# Altium integrated library Altium_PCB_Connector.IntLib: 293 symbols (part 2 of 3) (continued)
## S3B-XH-SM4-TB(LF)(SN)
designator P?
1x3P 3P XH 1 2.5mm 3 Brass Right-Angle Push-Pull,P=2.5mm Wire To Board / Wire To Wire Connector ROHS; Manufacturer: JST; Pin Number: 3; Contact Resistance: 20mOhm; Gender: Male; Rated Current: 3A; Withstanding Voltage: 1000VAC; Working Voltage: 250VAC; ComponentLink1Description: Datasheet; ComponentLink1URL: https://www.lcsc.com/datasheet/lcsc_datasheet_2304140030_JST-B2B-XH-A-LF-SN_C158012.pdf; Pitch: 2.5mm; Packaging: Bag; Type: Right Angled Bottom Locking; Supplier 1 URL: N/A; Supplier 2 URL: N/A; Supplier 3 URL: https://www.thegioiic.com/dau-xh2-54mm-3-chan-dan-smd-nam-ngang; Value: S3B-XH-SM4-TB(LF)(SN); LCSC Part #: C161860; Manufacturer Part Number: S3B-XH-SM4-TB(LF)(SN); Mount: SMD; Operating Temperature Max: + 85 C; Operating Temperature Min: - 20 C; Package / Case: 3; Supplier 1: Mouser; Supplier 1 Part Number: N/A; Supplier 2: Digi-Key; Supplier 2 Part Number: N/A; Supplier 3: thegioiic; Supplier 3 Part Number: N/A
footprint 619000311221 (2.54mm Male Left Angled Header Bottom Locking, 3p, SMD)
pins: 1, 2, 3

## S4B-XH-A(LF)(SN)
designator P?
1x4P 4P XH 1 2.5mm 4 Brass Right-Angle Push-Pull,P=2.5mm Wire To Board / Wire To Wire Connector ROHS; Manufacturer: JST; Pin Number: 4; Contact Resistance: 20mOhm; Gender: Male; Rated Current: 3A; Withstanding Voltage: 1000VAC; Working Voltage: 250VAC; ComponentLink1Description: Datasheet; ComponentLink1URL: https://www.lcsc.com/datasheet/lcsc_datasheet_2304140030_JST-B2B-XH-A-LF-SN_C158012.pdf; Pitch: 2.5mm; Packaging: Bag; Type: Right Angled Bottom Locking; Supplier 1 URL: N/A; Supplier 2 URL: N/A; Supplier 3 URL: https://www.thegioiic.com/dau-xh-2-54mm-4-chan-cong-xuyen-lo; Value: S4B-XH-A(LF)(SN); LCSC Part #: C157925; Manufacturer Part Number: S4B-XH-A(LF)(SN); Mount: THT; Operating Temperature Max: + 85 C; Operating Temperature Min: - 20 C; Package / Case: 4; Supplier 1: Mouser; Supplier 1 Part Number: N/A; Supplier 2: Digi-Key; Supplier 2 Part Number: N/A; Supplier 3: thegioiic; Supplier 3 Part Number: N/A
footprint 619000411021 (2.54mm Male Left Angled Header Bottom Locking, 4p)
pins: 1, 2, 3, 4

## S4B-XH-SM4-TB(LF)(SN)
designator P?
1x4P 4P XH 1 2.5mm 4 Brass Right-Angle Push-Pull,P=2.5mm Wire To Board / Wire To Wire Connector ROHS; Manufacturer: JST; Pin Number: 4; Contact Resistance: 20mOhm; Gender: Male; Rated Current: 3A; Withstanding Voltage: 1000VAC; Working Voltage: 250VAC; ComponentLink1Description: Datasheet; ComponentLink1URL: https://www.lcsc.com/datasheet/lcsc_datasheet_2304140030_JST-B2B-XH-A-LF-SN_C158012.pdf; Pitch: 2.5mm; Packaging: Bag; Type: Right Angled Bottom Locking; Supplier 1 URL: N/A; Supplier 2 URL: N/A; Supplier 3 URL: https://www.thegioiic.com/dau-xh2-54mm-4-chan-dan-smd-nam-ngang; Value: S4B-XH-SM4-TB(LF)(SN); LCSC Part #: C161861; Manufacturer Part Number: S4B-XH-SM4-TB(LF)(SN); Mount: SMD; Operating Temperature Max: + 85 C; Operating Temperature Min: - 20 C; Package / Case: 4; Supplier 1: Mouser; Supplier 1 Part Number: N/A; Supplier 2: Digi-Key; Supplier 2 Part Number: N/A; Supplier 3: thegioiic; Supplier 3 Part Number: N/A
footprint 619000411221 (2.54mm Male Left Angled Header Bottom Locking, 4p, SMD)
pins: 1, 2, 3, 4

## S5B-XH-A-1(LF)(SN)
designator P?
1x5P 5P XH 1 2.5mm 5 Brass Right-Angle Push-Pull,P=2.5mm Wire To Board / Wire To Wire Connector ROHS; Manufacturer: JST; Pin Number: 5; Contact Resistance: 20mOhm; Gender: Male; Rated Current: 3A; Withstanding Voltage: 1000VAC; Working Voltage: 250VAC; ComponentLink1Description: Datasheet; ComponentLink1URL: https://www.lcsc.com/datasheet/lcsc_datasheet_2304140030_JST-B2B-XH-A-LF-SN_C158012.pdf; Pitch: 2.5mm; Packaging: Bag; Type: Right Angled Bottom Locking; Supplier 1 URL: N/A; Supplier 2 URL: N/A; Supplier 3 URL: https://www.thegioiic.com/dau-xh-2-54mm-5-chan-cong-xuyen-lo; Value: S5B-XH-A-1(LF)(SN); LCSC Part #: C163038; Manufacturer Part Number: S5B-XH-A-1(LF)(SN); Mount: THT; Operating Temperature Max: + 85 C; Operating Temperature Min: - 20 C; Package / Case: 5; Supplier 1: Mouser; Supplier 1 Part Number: N/A; Supplier 2: Digi-Key; Supplier 2 Part Number: N/A; Supplier 3: thegioiic; Supplier 3 Part Number: N/A
footprint 619000511021 (2.54mm Male Locking Header, 5p)
pins: 1, 2, 3, 4, 5

## S5B-XH-SM4-TB(LF)(SN)
designator P?
1x5P 5P XH 1 2.5mm 5 Brass Right-Angle Push-Pull,P=2.5mm Wire To Board / Wire To Wire Connector ROHS; Manufacturer: JST; Pin Number: 5; Contact Resistance: 20mOhm; Gender: Male; Rated Current: 3A; Withstanding Voltage: 1000VAC; Working Voltage: 250VAC; ComponentLink1Description: Datasheet; ComponentLink1URL: https://www.lcsc.com/datasheet/lcsc_datasheet_2304140030_JST-B2B-XH-A-LF-SN_C158012.pdf; Pitch: 2.5mm; Packaging: Bag; Type: Right Angled Bottom Locking; Supplier 1 URL: N/A; Supplier 2 URL: N/A; Supplier 3 URL: https://www.thegioiic.com/dau-xh2-54mm-5-chan-dan-smd-nam-ngang; Value: S5B-XH-SM4-TB(LF)(SN); LCSC Part #: N/A; Manufacturer Part Number: S5B-XH-SM4-TB(LF)(SN); Mount: SMD; Operating Temperature Max: + 85 C; Operating Temperature Min: - 20 C; Package / Case: 5; Supplier 1: Mouser; Supplier 1 Part Number: N/A; Supplier 2: Digi-Key; Supplier 2 Part Number: N/A; Supplier 3: thegioiic; Supplier 3 Part Number: N/A
footprint 619000511221 (2.54mm Male Left Angled Header Bottom Locking, 5p, SMD)
pins: 1, 2, 3, 4, 5

## S6B-XH-A(LF)(SN)
designator P?
1x6P 6P XH 1 2.5mm 6 Brass Right-Angle Push-Pull,P=2.5mm Wire To Board / Wire To Wire Connector ROHS; Manufacturer: JST; Pin Number: 6; Contact Resistance: 20mOhm; Gender: Male; Rated Current: 3A; Withstanding Voltage: 1000VAC; Working Voltage: 250VAC; ComponentLink1Description: Datasheet; ComponentLink1URL: https://www.lcsc.com/datasheet/lcsc_datasheet_2304140030_JST-B2B-XH-A-LF-SN_C158012.pdf; Pitch: 2.5mm; Packaging: Bag; Type: Right Angled Bottom Locking; Supplier 1 URL: N/A; Supplier 2 URL: N/A; Supplier 3 URL: https://www.thegioiic.com/dau-xh-2-54mm-6-chan-cong-xuyen-lo; Value: S6B-XH-A(LF)(SN); LCSC Part #: C157919; Manufacturer Part Number: S6B-XH-A(LF)(SN); Mount: THT; Operating Temperature Max: + 85 C; Operating Temperature Min: - 20 C; Package / Case: 6; Supplier 1: Mouser; Supplier 1 Part Number: N/A; Supplier 2: Digi-Key; Supplier 2 Part Number: N/A; Supplier 3: thegioiic; Supplier 3 Part Number: N/A
footprint 619000611021 (2.54mm Male Locking Header, 6p)
pins: 1, 2, 3, 4, 5, 6

## S6B-XH-SM4-TB(LF)(SN)
designator P?
1x6P 6P XH 1 2.5mm 6 Brass Right-Angle Push-Pull,P=2.5mm Wire To Board / Wire To Wire Connector ROHS; Manufacturer: JST; Pin Number: 6; Contact Resistance: 20mOhm; Gender: Male; Rated Current: 3A; Withstanding Voltage: 1000VAC; Working Voltage: 250VAC; ComponentLink1Description: Datasheet; ComponentLink1URL: https://www.lcsc.com/datasheet/lcsc_datasheet_2304140030_JST-B2B-XH-A-LF-SN_C158012.pdf; Pitch: 2.5mm; Packaging: Bag; Type: Right Angled Bottom Locking; Supplier 1 URL: N/A; Supplier 2 URL: N/A; Supplier 3 URL: https://www.thegioiic.com/dau-xh2-54mm-6-chan-dan-smd-nam-ngang; Value: S6B-XH-SM4-TB(LF)(SN); LCSC Part #: C191914; Manufacturer Part Number: S6B-XH-SM4-TB(LF)(SN); Mount: SMD; Operating Temperature Max: + 85 C; Operating Temperature Min: - 20 C; Package / Case: 6; Supplier 1: Mouser; Supplier 1 Part Number: N/A; Supplier 2: Digi-Key; Supplier 2 Part Number: N/A; Supplier 3: thegioiic; Supplier 3 Part Number: N/A
footprint 619000611221 (2.54mm Male Left Angled Header Bottom Locking, 6p, SMD)
pins: 1, 2, 3, 4, 5, 6

## S7B-XH-A(LF)(SN)
designator P?
1x7P 7P XH 1 2.5mm 7 Brass Right-Angle Push-Pull,P=2.5mm Wire To Board / Wire To Wire Connector ROHS; Manufacturer: JST; Pin Number: 7; Contact Resistance: 20mOhm; Gender: Male; Rated Current: 3A; Withstanding Voltage: 1000VAC; Working Voltage: 250VAC; ComponentLink1Description: Datasheet; ComponentLink1URL: https://www.lcsc.com/datasheet/lcsc_datasheet_2304140030_JST-B2B-XH-A-LF-SN_C158012.pdf; Pitch: 2.5mm; Packaging: Bag; Type: Right Angled Bottom Locking; Supplier 1 URL: N/A; Supplier 2 URL: N/A; Supplier 3 URL: https://www.thegioiic.com/dau-xh-2-54mm-7-chan-cong-xuyen-lo; Value: S7B-XH-A(LF)(SN); LCSC Part #: C157916; Manufacturer Part Number: S7B-XH-A(LF)(SN); Mount: THT; Operating Temperature Max: + 85 C; Operating Temperature Min: - 20 C; Package / Case: 7; Supplier 1: Mouser; Supplier 1 Part Number: N/A; Supplier 2: Digi-Key; Supplier 2 Part Number: N/A; Supplier 3: thegioiic; Supplier 3 Part Number: N/A
footprint 619000711021 (2.54mm Male Locking Header, 7p)
pins: 1, 2, 3, 4, 5, 6, 7

## S7B-XH-SM4-TB(LF)(SN)
designator P?
1x7P 7P XH 1 2.5mm 7 Brass Right-Angle Push-Pull,P=2.5mm Wire To Board / Wire To Wire Connector ROHS; Manufacturer: JST; Pin Number: 7; Contact Resistance: 20mOhm; Gender: Male; Rated Current: 3A; Withstanding Voltage: 1000VAC; Working Voltage: 250VAC; ComponentLink1Description: Datasheet; ComponentLink1URL: https://www.lcsc.com/datasheet/lcsc_datasheet_2304140030_JST-B2B-XH-A-LF-SN_C158012.pdf; Pitch: 2.5mm; Packaging: Bag; Type: Right Angled Bottom Locking; Supplier 1 URL: N/A; Supplier 2 URL: N/A; Supplier 3 URL: https://www.thegioiic.com/dau-xh2-54mm-7-chan-dan-smd-nam-ngang; Value: S7B-XH-SM4-TB(LF)(SN); LCSC Part #: N/A; Manufacturer Part Number: S7B-XH-SM4-TB(LF)(SN); Mount: SMD; Operating Temperature Max: + 85 C; Operating Temperature Min: - 20 C; Package / Case: 7; Supplier 1: Mouser; Supplier 1 Part Number: N/A; Supplier 2: Digi-Key; Supplier 2 Part Number: N/A; Supplier 3: thegioiic; Supplier 3 Part Number: N/A
footprint 619000711221 (2.54mm Male Left Angled Header Bottom Locking, 7p, SMD)
pins: 1, 2, 3, 4, 5, 6, 7

## S8B-XH-A(LF)(SN)
designator P?
1x8P 8P XH 1 2.5mm 8 Brass Right-Angle Push-Pull,P=2.5mm Wire To Board / Wire To Wire Connector ROHS; Manufacturer: JST; Pin Number: 8; Contact Resistance: 20mOhm; Gender: Male; Rated Current: 3A; Withstanding Voltage: 1000VAC; Working Voltage: 250VAC; ComponentLink1Description: Datasheet; ComponentLink1URL: https://www.lcsc.com/datasheet/lcsc_datasheet_2304140030_JST-B2B-XH-A-LF-SN_C158012.pdf; Pitch: 2.5mm; Packaging: Bag; Type: Right Angled Bottom Locking; Supplier 1 URL: N/A; Supplier 2 URL: N/A; Supplier 3 URL: https://www.thegioiic.com/dau-xh-2-54mm-8-chan-cong-xuyen-lo; Value: S8B-XH-A(LF)(SN); LCSC Part #: C157914; Manufacturer Part Number: S8B-XH-A(LF)(SN); Mount: THT; Operating Temperature Max: + 85 C; Operating Temperature Min: - 20 C; Package / Case: 8; Supplier 1: Mouser; Supplier 1 Part Number: N/A; Supplier 2: Digi-Key; Supplier 2 Part Number: N/A; Supplier 3: thegioiic; Supplier 3 Part Number: N/A
footprint 619000811021 (2.54mm Male Locking Header, 8p)
pins: 1, 2, 3, 4, 5, 6, 7, 8

## S8B-XH-SM4-TB(LF)(SN)
designator P?
1x8P 8P XH 1 2.5mm 8 Brass Right-Angle Push-Pull,P=2.5mm Wire To Board / Wire To Wire Connector ROHS; Manufacturer: JST; Pin Number: 8; Contact Resistance: 20mOhm; Gender: Male; Rated Current: 3A; Withstanding Voltage: 1000VAC; Working Voltage: 250VAC; ComponentLink1Description: Datasheet; ComponentLink1URL: https://www.lcsc.com/datasheet/lcsc_datasheet_2304140030_JST-B2B-XH-A-LF-SN_C158012.pdf; Pitch: 2.5mm; Packaging: Bag; Type: Right Angled Bottom Locking; Supplier 1 URL: N/A; Supplier 2 URL: N/A; Supplier 3 URL: https://www.thegioiic.com/dau-xh2-54mm-8-chan-dan-smd-nam-ngang; Value: S8B-XH-SM4-TB(LF)(SN); LCSC Part #: N/A; Manufacturer Part Number: S8B-XH-SM4-TB(LF)(SN); Mount: SMD; Operating Temperature Max: + 85 C; Operating Temperature Min: - 20 C; Package / Case: 8; Supplier 1: Mouser; Supplier 1 Part Number: N/A; Supplier 2: Digi-Key; Supplier 2 Part Number: N/A; Supplier 3: thegioiic; Supplier 3 Part Number: N/A
footprint 619000811221 (2.54mm Male Left Angled Header Bottom Locking, 8p, SMD)
pins: 1, 2, 3, 4, 5, 6, 7, 8

## S9B-XH-A(LF)(SN)
designator P?
1x9P 9P XH 1 2.5mm 9 Brass Right-Angle Push-Pull,P=2.5mm Wire To Board / Wire To Wire Connector ROHS; Manufacturer: JST; Pin Number: 9; Contact Resistance: 20mOhm; Gender: Male; Rated Current: 3A; Withstanding Voltage: 1000VAC; Working Voltage: 250VAC; ComponentLink1Description: Datasheet; ComponentLink1URL: https://www.lcsc.com/datasheet/lcsc_datasheet_2304140030_JST-B2B-XH-A-LF-SN_C158012.pdf; Pitch: 2.5mm; Packaging: Bag; Type: Right Angled Bottom Locking; Supplier 1 URL: N/A; Supplier 2 URL: N/A; Supplier 3 URL: https://www.thegioiic.com/dau-xh-2-54mm-9-chan-cong-xuyen-lo; Value: S9B-XH-A(LF)(SN); LCSC Part #: C157911; Manufacturer Part Number: S9B-XH-A(LF)(SN); Mount: THT; Operating Temperature Max: + 85 C; Operating Temperature Min: - 20 C; Package / Case: 9; Supplier 1: Mouser; Supplier 1 Part Number: N/A; Supplier 2: Digi-Key; Supplier 2 Part Number: N/A; Supplier 3: thegioiic; Supplier 3 Part Number: N/A
footprint 619000911021 (2.54mm Male Locking Header, 7p)
pins: 1, 2, 3, 4, 5, 6, 7, 8, 9

## S9B-XH-SM4-TB(LF)(SN)
designator P?
1x9P 9P XH 1 2.5mm 9 Brass Right-Angle Push-Pull,P=2.5mm Wire To Board / Wire To Wire Connector ROHS; Manufacturer: JST; Pin Number: 9; Contact Resistance: 20mOhm; Gender: Male; Rated Current: 3A; Withstanding Voltage: 1000VAC; Working Voltage: 250VAC; ComponentLink1Description: Datasheet; ComponentLink1URL: https://www.lcsc.com/datasheet/lcsc_datasheet_2304140030_JST-B2B-XH-A-LF-SN_C158012.pdf; Pitch: 2.5mm; Packaging: Bag; Type: Right Angled Bottom Locking; Supplier 1 URL: N/A; Supplier 2 URL: N/A; Supplier 3 URL: N/A; Value: S9B-XH-SM4-TB(LF)(SN); LCSC Part #: N/A; Manufacturer Part Number: S9B-XH-SM4-TB(LF)(SN); Mount: SMD; Operating Temperature Max: + 85 C; Operating Temperature Min: - 20 C; Package / Case: 9; Supplier 1: Mouser; Supplier 1 Part Number: N/A; Supplier 2: Digi-Key; Supplier 2 Part Number: N/A; Supplier 3: thegioiic; Supplier 3 Part Number: N/A
footprint 619000911221 (2.54mm Male Left Angled Header Bottom Locking, 9p, SMD)
pins: 1, 2, 3, 4, 5, 6, 7, 8, 9

## S10B-XH-A(LF)(SN)
designator P?
1x10P 10P XH 1 2.5mm 10 Brass Right-Angle Push-Pull,P=2.5mm Wire To Board / Wire To Wire Connector ROHS; Manufacturer: JST; Pin Number: 10; Contact Resistance: 20mOhm; Gender: Male; Rated Current: 3A; Withstanding Voltage: 1000VAC; Working Voltage: 250VAC; ComponentLink1Description: Datasheet; ComponentLink1URL: https://www.lcsc.com/datasheet/lcsc_datasheet_2304140030_JST-B2B-XH-A-LF-SN_C158012.pdf; Pitch: 2.5mm; Packaging: Bag; Type: Right Angled Bottom Locking; Supplier 1 URL: N/A; Supplier 2 URL: N/A; Supplier 3 URL: https://www.thegioiic.com/dau-xh-2-54mm-10-chan-cong-xuyen-lo; Value: S10B-XH-A(LF)(SN); LCSC Part #: C378989; Manufacturer Part Number: S10B-XH-A(LF)(SN); Mount: THT; Operating Temperature Max: + 85 C; Operating Temperature Min: - 20 C; Package / Case: 10; Supplier 1: Mouser; Supplier 1 Part Number: N/A; Supplier 2: Digi-Key; Supplier 2 Part Number: N/A; Supplier 3: thegioiic; Supplier 3 Part Number: N/A
footprint 619001011021 (2.54mm Male Locking Header, 10p)
pins: 1, 2, 3, 4, 5, 6, 7, 8, 9, 10

## S10B-XH-SM4-TB(LF)(SN)
designator P?
1x10P 10P XH 1 2.5mm 10 Brass Right-Angle Push-Pull,P=2.5mm Wire To Board / Wire To Wire Connector ROHS; Manufacturer: JST; Pin Number: 10; Contact Resistance: 20mOhm; Gender: Male; Rated Current: 3A; Withstanding Voltage: 1000VAC; Working Voltage: 250VAC; ComponentLink1Description: Datasheet; ComponentLink1URL: https://www.lcsc.com/datasheet/lcsc_datasheet_2304140030_JST-B2B-XH-A-LF-SN_C158012.pdf; Pitch: 2.5mm; Packaging: Bag; Type: Right Angled Bottom Locking; Supplier 1 URL: N/A; Supplier 2 URL: N/A; Supplier 3 URL: N/A; Value: S10B-XH-SM4-TB(LF)(SN); LCSC Part #: N/A; Manufacturer Part Number: S10B-XH-SM4-TB(LF)(SN); Mount: SMD; Operating Temperature Max: + 85 C; Operating Temperature Min: - 20 C; Package / Case: 10; Supplier 1: Mouser; Supplier 1 Part Number: N/A; Supplier 2: Digi-Key; Supplier 2 Part Number: N/A; Supplier 3: thegioiic; Supplier 3 Part Number: N/A
footprint 619001011221 (2.54mm Male Left Angled Header Bottom Locking, 10p, SMD)
pins: 1, 2, 3, 4, 5, 6, 7, 8, 9, 10


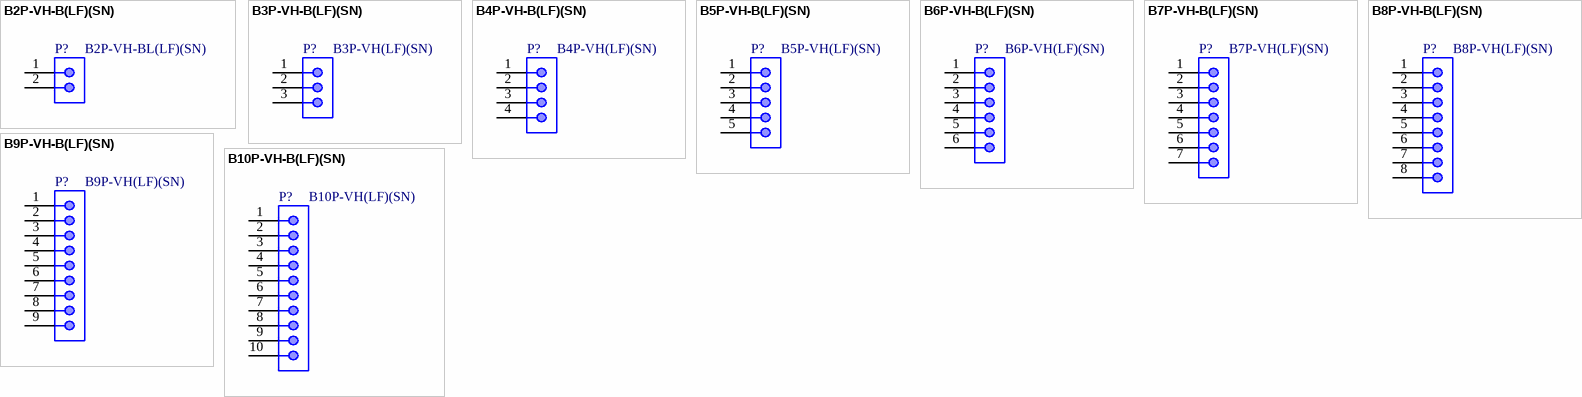
[diagram p11: symbols B2P-VH-B(LF)(SN) to B10P-VH-B(LF)(SN)]

## B2P-VH-B(LF)(SN)
designator P?, comment B2P-VH-BL(LF)(SN)
1x2P 2P VH Tin 4 -25℃~+85℃ 10A 1 3.96mm Brass Straight Plugin,P=3.96mm Wire To Board Connector ROHS; Manufacturer: JST; Pin Number: 2; Contact Resistance: 20mOhm; Gender: Male; Withstanding Voltage: 1000VAC; Working Voltage: 250VAC; ComponentLink1Description: Datasheet; ComponentLink1URL: https://www.lcsc.com/datasheet/lcsc_datasheet_2409302137_JST-B2P-VH-BL-LF-SN_C274411.pdf; Pitch: 3.96mm; Packaging: Plugin,P=3.96mm; Type: Standing paste; Rated Current: 10A; Supplier 1 URL: N/A; Supplier 2 URL: N/A; Supplier 3 URL: N/A; Value: B2P-VH-BL(LF)(SN); LCSC Part #: C274411; Manufacturer Part Number: B2P-VH-BL(LF)(SN); Mount: SMD; Operating Temperature Max: + 85 C; Operating Temperature Min: - 25 C; Package / Case: 2; Supplier 1: Mouser; Supplier 1 Part Number: N/A; Supplier 2: Digi-Key; Supplier 2 Part Number: N/A; Supplier 3: thegioiic; Supplier 3 Part Number: N/A
footprint B2P-VH(LF)(SN)
pins: 1, 2

## B3P-VH-B(LF)(SN)
designator P?, comment B3P-VH(LF)(SN)
1x3P 3P VH Tin 4 -25℃~+85℃ 10A 1 3.96mm Brass Straight Plugin,P=3.96mm Wire To Board Connector ROHS; Manufacturer: JST; Pin Number: 3; Contact Resistance: 20mOhm; Gender: Male; Withstanding Voltage: 1000VAC; Working Voltage: 250VAC; ComponentLink1Description: Datasheet; ComponentLink1URL: https://www.lcsc.com/datasheet/lcsc_datasheet_2409302137_JST-B2P-VH-BL-LF-SN_C274411.pdf; Pitch: 3.96mm; Packaging: Plugin,P=3.96mm; Type: Standing paste; Rated Current: 10A; Supplier 1 URL: N/A; Supplier 2 URL: N/A; Supplier 3 URL: N/A; Value: B3P-VH(LF)(SN); LCSC Part #: C160316; Manufacturer Part Number: B3P-VH(LF)(SN); Mount: SMD; Operating Temperature Max: + 85 C; Operating Temperature Min: - 25 C; Package / Case: 3; Supplier 1: Mouser; Supplier 1 Part Number: N/A; Supplier 2: Digi-Key; Supplier 2 Part Number: N/A; Supplier 3: thegioiic; Supplier 3 Part Number: N/A
footprint B3P-VH(LF)(SN)
pins: 1, 2, 3

## B4P-VH-B(LF)(SN)
designator P?, comment B4P-VH(LF)(SN)
1x4P 4P VH Tin 4 -25℃~+85℃ 10A 1 3.96mm Brass Straight Plugin,P=3.96mm Wire To Board Connector ROHS; Manufacturer: JST; Pin Number: 4; Contact Resistance: 20mOhm; Gender: Male; Withstanding Voltage: 1000VAC; Working Voltage: 250VAC; ComponentLink1Description: Datasheet; ComponentLink1URL: https://www.lcsc.com/datasheet/lcsc_datasheet_2409302137_JST-B2P-VH-BL-LF-SN_C274411.pdf; Pitch: 3.96mm; Packaging: Plugin,P=3.96mm; Type: Standing paste; Rated Current: 10A; Supplier 1 URL: N/A; Supplier 2 URL: N/A; Supplier 3 URL: N/A; Value: B4P-VH(LF)(SN); LCSC Part #: C160317; Manufacturer Part Number: B4P-VH(LF)(SN); Mount: SMD; Operating Temperature Max: + 85 C; Operating Temperature Min: - 25 C; Package / Case: 4; Supplier 1: Mouser; Supplier 1 Part Number: N/A; Supplier 2: Digi-Key; Supplier 2 Part Number: N/A; Supplier 3: thegioiic; Supplier 3 Part Number: N/A
footprint B4P-VH(LF)(SN)
pins: 1, 2, 3, 4

## B5P-VH-B(LF)(SN)
designator P?, comment B5P-VH(LF)(SN)
1x5P 5P VH Tin 4 -25℃~+85℃ 10A 1 3.96mm Brass Straight Plugin,P=3.96mm Wire To Board Connector ROHS; Manufacturer: JST; Pin Number: 5; Contact Resistance: 20mOhm; Gender: Male; Withstanding Voltage: 1000VAC; Working Voltage: 250VAC; ComponentLink1Description: Datasheet; ComponentLink1URL: https://www.lcsc.com/datasheet/lcsc_datasheet_2409302137_JST-B2P-VH-BL-LF-SN_C274411.pdf; Pitch: 3.96mm; Packaging: Plugin,P=3.96mm; Type: Standing paste; Rated Current: 10A; Supplier 1 URL: N/A; Supplier 2 URL: N/A; Supplier 3 URL: N/A; Value: B5P-VH(LF)(SN); LCSC Part #: C160318; Manufacturer Part Number: B5P-VH(LF)(SN); Mount: SMD; Operating Temperature Max: + 85 C; Operating Temperature Min: - 25 C; Package / Case: 5; Supplier 1: Mouser; Supplier 1 Part Number: N/A; Supplier 2: Digi-Key; Supplier 2 Part Number: N/A; Supplier 3: thegioiic; Supplier 3 Part Number: N/A
footprint B5P-VH(LF)(SN)
pins: 1, 2, 3, 4, 5

## B6P-VH-B(LF)(SN)
designator P?, comment B6P-VH(LF)(SN)
1x6P 6P VH Tin 4 -25℃~+85℃ 10A 1 3.96mm Brass Straight Plugin,P=3.96mm Wire To Board Connector ROHS; Manufacturer: JST; Pin Number: 6; Contact Resistance: 20mOhm; Gender: Male; Withstanding Voltage: 1000VAC; Working Voltage: 250VAC; ComponentLink1Description: Datasheet; ComponentLink1URL: https://www.lcsc.com/datasheet/lcsc_datasheet_2409302137_JST-B2P-VH-BL-LF-SN_C274411.pdf; Pitch: 3.96mm; Packaging: Plugin,P=3.96mm; Type: Standing paste; Rated Current: 10A; Supplier 1 URL: N/A; Supplier 2 URL: N/A; Supplier 3 URL: N/A; Value: B6P-VH(LF)(SN); LCSC Part #: C160314; Manufacturer Part Number: B6P-VH(LF)(SN); Mount: SMD; Operating Temperature Max: + 85 C; Operating Temperature Min: - 25 C; Package / Case: 6; Supplier 1: Mouser; Supplier 1 Part Number: N/A; Supplier 2: Digi-Key; Supplier 2 Part Number: N/A; Supplier 3: thegioiic; Supplier 3 Part Number: N/A
footprint B6P-VH(LF)(SN)
pins: 1, 2, 3, 4, 5, 6

## B7P-VH-B(LF)(SN)
designator P?, comment B7P-VH(LF)(SN)
1x7P 7P VH Tin 4 -25℃~+85℃ 10A 1 3.96mm Brass Straight Plugin,P=3.96mm Wire To Board Connector ROHS; Manufacturer: JST; Pin Number: 7; Contact Resistance: 20mOhm; Gender: Male; Withstanding Voltage: 1000VAC; Working Voltage: 250VAC; ComponentLink1Description: Datasheet; ComponentLink1URL: https://www.lcsc.com/datasheet/lcsc_datasheet_2409302137_JST-B2P-VH-BL-LF-SN_C274411.pdf; Pitch: 3.96mm; Packaging: Plugin,P=3.96mm; Type: Standing paste; Rated Current: 10A; Supplier 1 URL: N/A; Supplier 2 URL: N/A; Supplier 3 URL: N/A; Value: B7P-VH(LF)(SN); LCSC Part #: C160319; Manufacturer Part Number: B7P-VH(LF)(SN); Mount: SMD; Operating Temperature Max: + 85 C; Operating Temperature Min: - 25 C; Package / Case: 7; Supplier 1: Mouser; Supplier 1 Part Number: N/A; Supplier 2: Digi-Key; Supplier 2 Part Number: N/A; Supplier 3: thegioiic; Supplier 3 Part Number: N/A
footprint B7P-VH(LF)(SN)
pins: 1, 2, 3, 4, 5, 6, 7

## B8P-VH-B(LF)(SN)
designator P?, comment B8P-VH(LF)(SN)
1x8P 8P VH Tin 4 -25℃~+85℃ 10A 1 3.96mm Brass Straight Plugin,P=3.96mm Wire To Board Connector ROHS; Manufacturer: JST; Pin Number: 8; Contact Resistance: 20mOhm; Gender: Male; Withstanding Voltage: 1000VAC; Working Voltage: 250VAC; ComponentLink1Description: Datasheet; ComponentLink1URL: https://www.lcsc.com/datasheet/lcsc_datasheet_2409302137_JST-B2P-VH-BL-LF-SN_C274411.pdf; Pitch: 3.96mm; Packaging: Plugin,P=3.96mm; Type: Standing paste; Rated Current: 10A; Supplier 1 URL: N/A; Supplier 2 URL: N/A; Supplier 3 URL: N/A; Value: B8P-VH(LF)(SN); LCSC Part #: C160320; Manufacturer Part Number: B8P-VH(LF)(SN); Mount: SMD; Operating Temperature Max: + 85 C; Operating Temperature Min: - 25 C; Package / Case: 8; Supplier 1: Mouser; Supplier 1 Part Number: N/A; Supplier 2: Digi-Key; Supplier 2 Part Number: N/A; Supplier 3: thegioiic; Supplier 3 Part Number: N/A
footprint B8P-VH(LF)(SN)
pins: 1, 2, 3, 4, 5, 6, 7, 8

## B9P-VH-B(LF)(SN)
designator P?, comment B9P-VH(LF)(SN)
1x9P 9P VH Tin 4 -25℃~+85℃ 10A 1 3.96mm Brass Straight Plugin,P=3.96mm Wire To Board Connector ROHS; Manufacturer: JST; Pin Number: 9; Contact Resistance: 20mOhm; Gender: Male; Withstanding Voltage: 1000VAC; Working Voltage: 250VAC; ComponentLink1Description: Datasheet; ComponentLink1URL: https://www.lcsc.com/datasheet/lcsc_datasheet_2409302137_JST-B2P-VH-BL-LF-SN_C274411.pdf; Pitch: 3.96mm; Packaging: Plugin,P=3.96mm; Type: Standing paste; Rated Current: 10A; Supplier 1 URL: N/A; Supplier 2 URL: N/A; Supplier 3 URL: N/A; Value: B9P-VH(LF)(SN); LCSC Part #: C160321; Manufacturer Part Number: B9P-VH(LF)(SN); Mount: SMD; Operating Temperature Max: + 85 C; Operating Temperature Min: - 25 C; Package / Case: 9; Supplier 1: Mouser; Supplier 1 Part Number: N/A; Supplier 2: Digi-Key; Supplier 2 Part Number: N/A; Supplier 3: thegioiic; Supplier 3 Part Number: N/A
footprint B9P-VH(LF)(SN)
pins: 1, 2, 3, 4, 5, 6, 7, 8, 9

## B10P-VH-B(LF)(SN)
designator P?, comment B10P-VH(LF)(SN)
1x10P 10P VH Tin 4 -25℃~+85℃ 10A 1 3.96mm Brass Straight Plugin,P=3.96mm Wire To Board Connector ROHS; Manufacturer: JST; Pin Number: 10; Contact Resistance: 20mOhm; Gender: Male; Withstanding Voltage: 1000VAC; Working Voltage: 250VAC; ComponentLink1Description: Datasheet; ComponentLink1URL: https://www.lcsc.com/datasheet/lcsc_datasheet_2409302137_JST-B2P-VH-BL-LF-SN_C274411.pdf; Pitch: 3.96mm; Packaging: Plugin,P=3.96mm; Type: Standing paste; Rated Current: 10A; Supplier 1 URL: N/A; Supplier 2 URL: N/A; Supplier 3 URL: N/A; Value: B10P-VH(LF)(SN); LCSC Part #: C160322; Manufacturer Part Number: B10P-VH(LF)(SN); Mount: SMD; Operating Temperature Max: + 85 C; Operating Temperature Min: - 25 C; Package / Case: 10; Supplier 1: Mouser; Supplier 1 Part Number: N/A; Supplier 2: Digi-Key; Supplier 2 Part Number: N/A; Supplier 3: thegioiic; Supplier 3 Part Number: N/A
footprint B10P-VH(LF)(SN)
pins: 1, 2, 3, 4, 5, 6, 7, 8, 9, 10


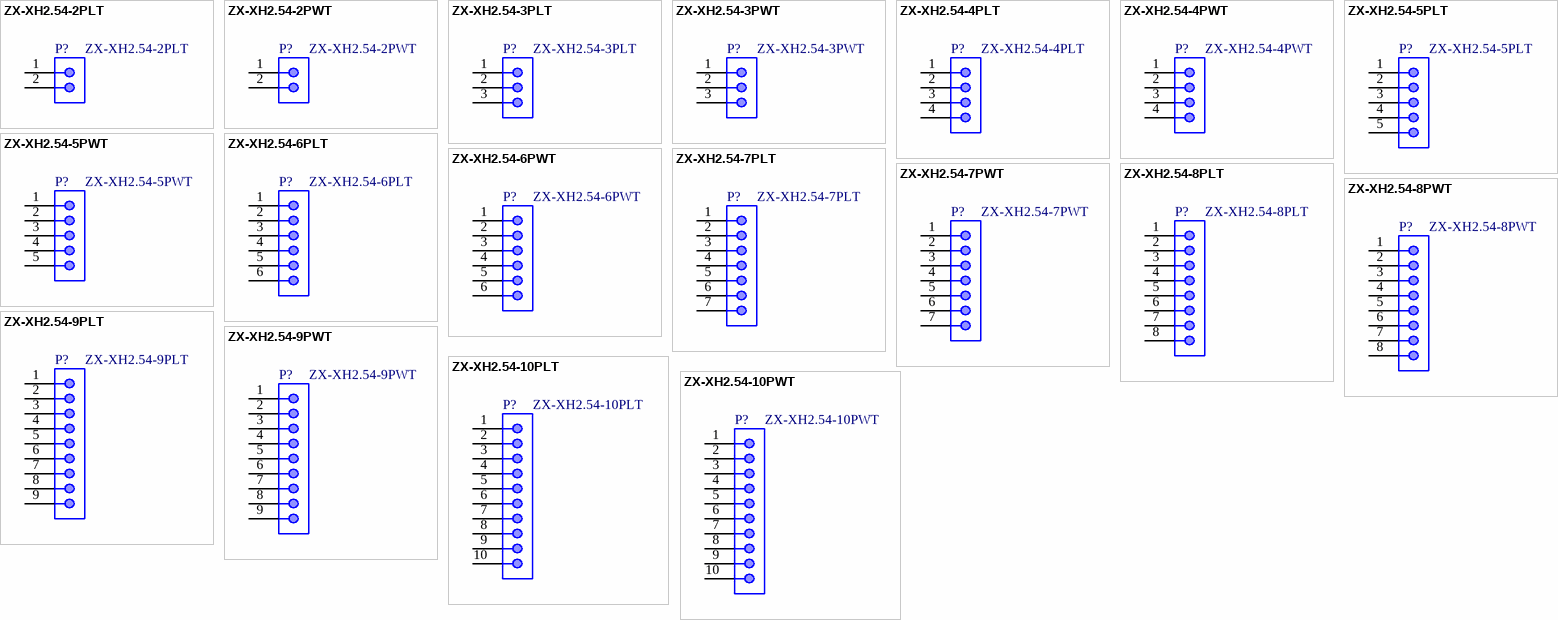
[diagram p12: symbols ZX-XH2.54-2PLT to ZX-XH2.54-10PWT]

## ZX-XH2.54-2PLT
designator P?
1x2P 2P XH 1 2.54mm Tin 2 -25℃~+85℃ Brass 3A Standing paste SMD,P=2.54mm Wire To Board Connector ROHS; Manufacturer: Megastar; Pin Number: 2; Contact Resistance: 20mOhm; Gender: Male; Withstanding Voltage: 1000VAC; Working Voltage: 250VAC; ComponentLink1Description: Datasheet; ComponentLink1URL: https://www.lcsc.com/datasheet/lcsc_datasheet_2306191415_Megastar-ZX-XH2-54-10PLT_C7429688.pdf; Pitch: 2.54mm; Packaging: SMD,P=2.54mm; Type: Standing paste; Rated Current: 3A; Supplier 1 URL: N/A; Supplier 2 URL: N/A; Supplier 3 URL: N/A; Value: ZX-XH2.54-2PLT; LCSC Part #: C7429680; Manufacturer Part Number: ZX-XH2.54-2PLT; Mount: SMD; Operating Temperature Max: + 85 C; Operating Temperature Min: - 25 C; Package / Case: 2; Supplier 1: Mouser; Supplier 1 Part Number: N/A; Supplier 2: Digi-Key; Supplier 2 Part Number: N/A; Supplier 3: thegioiic; Supplier 3 Part Number: N/A
footprint ZX-XH2.54-2PLT
pins: 1, 2

## ZX-XH2.54-2PWT
designator P?
1x2P 2P XH 1 2.54mm Tin 2 -25℃~+85℃ Brass 3A Horizontal attachment SMD,P=2.54mm,Surface Mount，Right Angle Wire To Board Connector ROHS; Manufacturer: Megastar; Pin Number: 2; Contact Resistance: 20mOhm; Gender: Male; Withstanding Voltage: 1000VAC; Working Voltage: 250VAC; ComponentLink1Description: Datasheet; ComponentLink1URL: https://www.lcsc.com/datasheet/lcsc_datasheet_2306191414_Megastar-ZX-XH2-54-2PWT_C7429671.pdf; Pitch: 2.54mm; Packaging: SMD,P=2.54mm,Surface Mount，Right Angle; Type: Right Angled Bottom Locking; Rated Current: 3A; Supplier 1 URL: N/A; Supplier 2 URL: N/A; Supplier 3 URL: N/A; Value: ZX-XH2.54-2PWT; LCSC Part #: C7429671; Manufacturer Part Number: ZX-XH2.54-2PWT; Mount: SMD; Operating Temperature Max: + 85 C; Operating Temperature Min: - 25 C; Package / Case: 2; Supplier 1: Mouser; Supplier 1 Part Number: N/A; Supplier 2: Digi-Key; Supplier 2 Part Number: N/A; Supplier 3: thegioiic; Supplier 3 Part Number: N/A
footprint ZX-XH2.54-2PWT
pins: 1, 2

## ZX-XH2.54-3PLT
designator P?
1x3P 3P XH 1 2.54mm Tin 3 -25℃~+85℃ Brass 3A Standing paste SMD,P=2.54mm Wire To Board Connector ROHS; Manufacturer: Megastar; Pin Number: 3; Contact Resistance: 20mOhm; Gender: Male; Withstanding Voltage: 1000VAC; Working Voltage: 250VAC; ComponentLink1Description: Datasheet; ComponentLink1URL: https://www.lcsc.com/datasheet/lcsc_datasheet_2306191415_Megastar-ZX-XH2-54-10PLT_C7429688.pdf; Pitch: 2.54mm; Packaging: SMD,P=2.54mm; Type: Standing paste; Rated Current: 3A; Supplier 1 URL: N/A; Supplier 2 URL: N/A; Supplier 3 URL: N/A; Value: ZX-XH2.54-3PLT; LCSC Part #: C7429681; Manufacturer Part Number: ZX-XH2.54-3PLT; Mount: SMD; Operating Temperature Max: + 85 C; Operating Temperature Min: - 25 C; Package / Case: 3; Supplier 1: Mouser; Supplier 1 Part Number: N/A; Supplier 2: Digi-Key; Supplier 2 Part Number: N/A; Supplier 3: thegioiic; Supplier 3 Part Number: N/A
footprint ZX-XH2.54-3PLT
pins: 1, 2, 3

## ZX-XH2.54-3PWT
designator P?
1x3P 3P XH 1 2.54mm Tin 3 -25℃~+85℃ Brass 3A Horizontal attachment SMD,P=2.54mm,Surface Mount，Right Angle Wire To Board Connector ROHS; Manufacturer: Megastar; Pin Number: 3; Contact Resistance: 20mOhm; Gender: Male; Withstanding Voltage: 1000VAC; Working Voltage: 250VAC; ComponentLink1Description: Datasheet; ComponentLink1URL: https://www.lcsc.com/datasheet/lcsc_datasheet_2306191414_Megastar-ZX-XH2-54-2PWT_C7429671.pdf; Pitch: 2.54mm; Packaging: SMD,P=2.54mm,Surface Mount，Right Angle; Type: Right Angled Bottom Locking; Rated Current: 3A; Supplier 1 URL: N/A; Supplier 2 URL: N/A; Supplier 3 URL: N/A; Value: ZX-XH2.54-3PWT; LCSC Part #: C7429672; Manufacturer Part Number: ZX-XH2.54-3PWT; Mount: SMD; Operating Temperature Max: + 85 C; Operating Temperature Min: - 25 C; Package / Case: 3; Supplier 1: Mouser; Supplier 1 Part Number: N/A; Supplier 2: Digi-Key; Supplier 2 Part Number: N/A; Supplier 3: thegioiic; Supplier 3 Part Number: N/A
footprint ZX-XH2.54-3PWT (2.54mm Male Left Angled Header Bottom Locking, 3p, SMD)
pins: 1, 2, 3

## ZX-XH2.54-4PLT
designator P?
1x4P 4P XH 1 2.54mm Tin 4 -25℃~+85℃ Brass 3A Standing paste SMD,P=2.54mm Wire To Board Connector ROHS; Manufacturer: Megastar; Pin Number: 4; Contact Resistance: 20mOhm; Gender: Male; Withstanding Voltage: 1000VAC; Working Voltage: 250VAC; ComponentLink1Description: Datasheet; ComponentLink1URL: https://www.lcsc.com/datasheet/lcsc_datasheet_2306191415_Megastar-ZX-XH2-54-10PLT_C7429688.pdf; Pitch: 2.54mm; Packaging: SMD,P=2.54mm; Type: Standing paste; Rated Current: 3A; Supplier 1 URL: N/A; Supplier 2 URL: N/A; Supplier 3 URL: N/A; Value: ZX-XH2.54-4PLT; LCSC Part #: C7429682; Manufacturer Part Number: ZX-XH2.54-4PLT; Mount: SMD; Operating Temperature Max: + 85 C; Operating Temperature Min: - 25 C; Package / Case: 4; Supplier 1: Mouser; Supplier 1 Part Number: N/A; Supplier 2: Digi-Key; Supplier 2 Part Number: N/A; Supplier 3: thegioiic; Supplier 3 Part Number: N/A
footprint ZX-XH2.54-4PLT
pins: 1, 2, 3, 4

## ZX-XH2.54-4PWT
designator P?
1x4P 4P XH 1 2.54mm Tin 4 -25℃~+85℃ Brass 3A Horizontal attachment SMD,P=2.54mm,Surface Mount，Right Angle Wire To Board Connector ROHS; Manufacturer: Megastar; Pin Number: 4; Contact Resistance: 20mOhm; Gender: Male; Withstanding Voltage: 1000VAC; Working Voltage: 250VAC; ComponentLink1Description: Datasheet; ComponentLink1URL: https://www.lcsc.com/datasheet/lcsc_datasheet_2306191414_Megastar-ZX-XH2-54-2PWT_C7429671.pdf; Pitch: 2.54mm; Packaging: SMD,P=2.54mm,Surface Mount，Right Angle; Type: Right Angled Bottom Locking; Rated Current: 3A; Supplier 1 URL: N/A; Supplier 2 URL: N/A; Supplier 3 URL: N/A; Value: ZX-XH2.54-4PWT; LCSC Part #: C7429673; Manufacturer Part Number: ZX-XH2.54-4PWT; Mount: SMD; Operating Temperature Max: + 85 C; Operating Temperature Min: - 25 C; Package / Case: 4; Supplier 1: Mouser; Supplier 1 Part Number: N/A; Supplier 2: Digi-Key; Supplier 2 Part Number: N/A; Supplier 3: thegioiic; Supplier 3 Part Number: N/A
footprint ZX-XH2.54-4PWT (2.54mm Male Left Angled Header Bottom Locking, 4p, SMD)
pins: 1, 2, 3, 4

## ZX-XH2.54-5PLT
designator P?
1x5P 5P XH 1 2.54mm Tin 5 -25℃~+85℃ Brass 3A Standing paste SMD,P=2.54mm Wire To Board Connector ROHS; Manufacturer: Megastar; Pin Number: 5; Contact Resistance: 20mOhm; Gender: Male; Withstanding Voltage: 1000VAC; Working Voltage: 250VAC; ComponentLink1Description: Datasheet; ComponentLink1URL: https://www.lcsc.com/datasheet/lcsc_datasheet_2306191415_Megastar-ZX-XH2-54-10PLT_C7429688.pdf; Pitch: 2.54mm; Packaging: SMD,P=2.54mm; Type: Standing paste; Rated Current: 3A; Supplier 1 URL: N/A; Supplier 2 URL: N/A; Supplier 3 URL: N/A; Value: ZX-XH2.54-5PLT; LCSC Part #: C7429683; Manufacturer Part Number: ZX-XH2.54-5PLT; Mount: SMD; Operating Temperature Max: + 85 C; Operating Temperature Min: - 25 C; Package / Case: 5; Supplier 1: Mouser; Supplier 1 Part Number: N/A; Supplier 2: Digi-Key; Supplier 2 Part Number: N/A; Supplier 3: thegioiic; Supplier 3 Part Number: N/A
footprint ZX-XH2.54-5PLT
pins: 1, 2, 3, 4, 5

## ZX-XH2.54-5PWT
designator P?
1x5P 5P XH 1 2.54mm Tin 5 -25℃~+85℃ Brass 3A Horizontal attachment SMD,P=2.54mm,Surface Mount，Right Angle Wire To Board Connector ROHS; Manufacturer: Megastar; Pin Number: 5; Contact Resistance: 20mOhm; Gender: Male; Withstanding Voltage: 1000VAC; Working Voltage: 250VAC; ComponentLink1Description: Datasheet; ComponentLink1URL: https://www.lcsc.com/datasheet/lcsc_datasheet_2306191414_Megastar-ZX-XH2-54-2PWT_C7429671.pdf; Pitch: 2.54mm; Packaging: SMD,P=2.54mm,Surface Mount，Right Angle; Type: Right Angled Bottom Locking; Rated Current: 3A; Supplier 1 URL: N/A; Supplier 2 URL: N/A; Supplier 3 URL: N/A; Value: ZX-XH2.54-5PWT; LCSC Part #: C7429674; Manufacturer Part Number: ZX-XH2.54-5PWT; Mount: SMD; Operating Temperature Max: + 85 C; Operating Temperature Min: - 25 C; Package / Case: 5; Supplier 1: Mouser; Supplier 1 Part Number: N/A; Supplier 2: Digi-Key; Supplier 2 Part Number: N/A; Supplier 3: thegioiic; Supplier 3 Part Number: N/A
footprint ZX-XH2.54-5PWT (2.54mm Male Left Angled Header Bottom Locking, 5p, SMD)
pins: 1, 2, 3, 4, 5

## ZX-XH2.54-6PLT
designator P?
1x6P 6P XH 1 2.54mm Tin 6 -25℃~+85℃ Brass 3A Standing paste SMD,P=2.54mm Wire To Board Connector ROHS; Manufacturer: Megastar; Pin Number: 6; Contact Resistance: 20mOhm; Gender: Male; Withstanding Voltage: 1000VAC; Working Voltage: 250VAC; ComponentLink1Description: Datasheet; ComponentLink1URL: https://www.lcsc.com/datasheet/lcsc_datasheet_2306191415_Megastar-ZX-XH2-54-10PLT_C7429688.pdf; Pitch: 2.54mm; Packaging: SMD,P=2.54mm; Type: Standing paste; Rated Current: 3A; Supplier 1 URL: N/A; Supplier 2 URL: N/A; Supplier 3 URL: N/A; Value: ZX-XH2.54-6PLT; LCSC Part #: C7429684; Manufacturer Part Number: ZX-XH2.54-6PLT; Mount: SMD; Operating Temperature Max: + 85 C; Operating Temperature Min: - 25 C; Package / Case: 6; Supplier 1: Mouser; Supplier 1 Part Number: N/A; Supplier 2: Digi-Key; Supplier 2 Part Number: N/A; Supplier 3: thegioiic; Supplier 3 Part Number: N/A
footprint ZX-XH2.54-6PLT
pins: 1, 2, 3, 4, 5, 6

## ZX-XH2.54-6PWT
designator P?
1x6P 6P XH 1 2.54mm Tin 6 -25℃~+85℃ Brass 3A Horizontal attachment SMD,P=2.54mm,Surface Mount，Right Angle Wire To Board Connector ROHS; Manufacturer: Megastar; Pin Number: 6; Contact Resistance: 20mOhm; Gender: Male; Withstanding Voltage: 1000VAC; Working Voltage: 250VAC; ComponentLink1Description: Datasheet; ComponentLink1URL: https://www.lcsc.com/datasheet/lcsc_datasheet_2306191414_Megastar-ZX-XH2-54-2PWT_C7429671.pdf; Pitch: 2.54mm; Packaging: SMD,P=2.54mm,Surface Mount，Right Angle; Type: Right Angled Bottom Locking; Rated Current: 3A; Supplier 1 URL: N/A; Supplier 2 URL: N/A; Supplier 3 URL: N/A; Value: ZX-XH2.54-6PWT; LCSC Part #: C7429675; Manufacturer Part Number: ZX-XH2.54-6PWT; Mount: SMD; Operating Temperature Max: + 85 C; Operating Temperature Min: - 25 C; Package / Case: 6; Supplier 1: Mouser; Supplier 1 Part Number: N/A; Supplier 2: Digi-Key; Supplier 2 Part Number: N/A; Supplier 3: thegioiic; Supplier 3 Part Number: N/A
footprint ZX-XH2.54-6PWT (2.54mm Male Left Angled Header Bottom Locking, 6p, SMD)
pins: 1, 2, 3, 4, 5, 6

## ZX-XH2.54-7PLT
designator P?
1x7P 7P XH 1 2.54mm Tin 7 -25℃~+85℃ Brass 3A Standing paste SMD,P=2.54mm Wire To Board Connector ROHS; Manufacturer: Megastar; Pin Number: 7; Contact Resistance: 20mOhm; Gender: Male; Withstanding Voltage: 1000VAC; Working Voltage: 250VAC; ComponentLink1Description: Datasheet; ComponentLink1URL: https://www.lcsc.com/datasheet/lcsc_datasheet_2306191415_Megastar-ZX-XH2-54-10PLT_C7429688.pdf; Pitch: 2.54mm; Packaging: SMD,P=2.54mm; Type: Standing paste; Rated Current: 3A; Supplier 1 URL: N/A; Supplier 2 URL: N/A; Supplier 3 URL: N/A; Value: ZX-XH2.54-7PLT; LCSC Part #: C7429685; Manufacturer Part Number: ZX-XH2.54-7PLT; Mount: SMD; Operating Temperature Max: + 85 C; Operating Temperature Min: - 25 C; Package / Case: 7; Supplier 1: Mouser; Supplier 1 Part Number: N/A; Supplier 2: Digi-Key; Supplier 2 Part Number: N/A; Supplier 3: thegioiic; Supplier 3 Part Number: N/A
footprint ZX-XH2.54-7PLT
pins: 1, 2, 3, 4, 5, 6, 7

## ZX-XH2.54-7PWT
designator P?
1x7P 7P XH 1 2.54mm Tin 7 -25℃~+85℃ Brass 3A Horizontal attachment SMD,P=2.54mm,Surface Mount，Right Angle Wire To Board Connector ROHS; Manufacturer: Megastar; Pin Number: 7; Contact Resistance: 20mOhm; Gender: Male; Withstanding Voltage: 1000VAC; Working Voltage: 250VAC; ComponentLink1Description: Datasheet; ComponentLink1URL: https://www.lcsc.com/datasheet/lcsc_datasheet_2306191414_Megastar-ZX-XH2-54-2PWT_C7429671.pdf; Pitch: 2.54mm; Packaging: SMD,P=2.54mm,Surface Mount，Right Angle; Type: Right Angled Bottom Locking; Rated Current: 3A; Supplier 1 URL: N/A; Supplier 2 URL: N/A; Supplier 3 URL: N/A; Value: ZX-XH2.54-7PWT; LCSC Part #: C7429676; Manufacturer Part Number: ZX-XH2.54-7PWT; Mount: SMD; Operating Temperature Max: + 85 C; Operating Temperature Min: - 25 C; Package / Case: 7; Supplier 1: Mouser; Supplier 1 Part Number: N/A; Supplier 2: Digi-Key; Supplier 2 Part Number: N/A; Supplier 3: thegioiic; Supplier 3 Part Number: N/A
footprint ZX-XH2.54-7PWT (2.54mm Male Left Angled Header Bottom Locking, 7p, SMD)
pins: 1, 2, 3, 4, 5, 6, 7

## ZX-XH2.54-8PLT
designator P?
1x8P 8P XH 1 2.54mm Tin 8 -25℃~+85℃ Brass 3A Standing paste SMD,P=2.54mm Wire To Board Connector ROHS; Manufacturer: Megastar; Pin Number: 8; Contact Resistance: 20mOhm; Gender: Male; Withstanding Voltage: 1000VAC; Working Voltage: 250VAC; ComponentLink1Description: Datasheet; ComponentLink1URL: https://www.lcsc.com/datasheet/lcsc_datasheet_2306191415_Megastar-ZX-XH2-54-10PLT_C7429688.pdf; Pitch: 2.54mm; Packaging: SMD,P=2.54mm; Type: Standing paste; Rated Current: 3A; Supplier 1 URL: N/A; Supplier 2 URL: N/A; Supplier 3 URL: N/A; Value: ZX-XH2.54-8PLT; LCSC Part #: C7429686; Manufacturer Part Number: ZX-XH2.54-8PLT; Mount: SMD; Operating Temperature Max: + 85 C; Operating Temperature Min: - 25 C; Package / Case: 8; Supplier 1: Mouser; Supplier 1 Part Number: N/A; Supplier 2: Digi-Key; Supplier 2 Part Number: N/A; Supplier 3: thegioiic; Supplier 3 Part Number: N/A
footprint ZX-XH2.54-8PLT
pins: 1, 2, 3, 4, 5, 6, 7, 8